# Altium integrated library Weidmueller_OMNIMATE_Signal.IntLib: 2550 symbols (part 7 of 45) (continued)
## 1146740000 (continued)
OMNIMATE Signal - series BL/SL 5.08; PartNumber: 1146740000; Manufacturer: Weidmueller; Short_text_for_material: SL 5.08HC/03/90 3.2SN OR BX; Side_termination_characteristic: open side; Mounting_onto_the_PCB: Solder connection; Pitch_mm: 5.08 mm; Pitch_inch: 0.2 inch; No_of_poles: 3; Outgoing_elbow: 90°; Solder_pin_length_mm: 3.2 mm; Contact_material: Cu-Leg; Contact_surface: tinned; Insulating_material: PA GF; UL_94_flammability_rating: V-0; Rated_voltage_for_surge_voltage_class_pollution_degree_II_2: 400 V; Rated_voltage_use_group_B_UL_1059: 300 V; Rated_current_use_group_B_UL_1059: 15 A; PackageReference: SL_5_08HC_90_03; Colour: Orange; Packaging: Box; Qty: 100 PCS; Revision: V1; ComponentLink1Description: Manufacturer URL; ComponentLink1URL: http://www.weidmueller.com/; ComponentLink2Description: URL Link1; ComponentLink2URL: http://catalog.weidmueller.com/catalog/Start.do?localeId=en&ObjectID=1146740000
footprint SL_5_08HC_90_03 (OMNIMATE Signal - Serie BL/SL 5.08  SL 5.08HC/03/90 3.2)
pins: A1, A2, A3

## 1146740000_Single
designator J?
OMNIMATE Signal - series BL/SL 5.08; PartNumber: 1146740000; Manufacturer: Weidmueller; Short_text_for_material: SL 5.08HC/03/90 3.2SN OR BX; Side_termination_characteristic: open side; Mounting_onto_the_PCB: Solder connection; Pitch_mm: 5.08 mm; Pitch_inch: 0.2 inch; No_of_poles: 3; Outgoing_elbow: 90°; Solder_pin_length_mm: 3.2 mm; Contact_material: Cu-Leg; Contact_surface: tinned; Insulating_material: PA GF; UL_94_flammability_rating: V-0; Rated_voltage_for_surge_voltage_class_pollution_degree_II_2: 400 V; Rated_voltage_use_group_B_UL_1059: 300 V; Rated_current_use_group_B_UL_1059: 15 A; PackageReference: SL_5_08HC_90_03; Colour: Orange; Packaging: Box; Qty: 100 PCS; Revision: V1; ComponentLink1Description: Manufacturer URL; ComponentLink1URL: http://www.weidmueller.com/; ComponentLink2Description: URL Link1; ComponentLink2URL: http://catalog.weidmueller.com/catalog/Start.do?localeId=en&ObjectID=1146740000
footprint SL_5_08HC_90_03 (OMNIMATE Signal - Serie BL/SL 5.08  SL 5.08HC/03/90 3.2)
part A pins: A1
part B pins: A2
part C pins: A3

## 1146770000
designator J?
OMNIMATE Signal - series BL/SL 5.08; PartNumber: 1146770000; Manufacturer: Weidmueller; Short_text_for_material: SL 5.08HC/04/90 3.2SN OR BX; Side_termination_characteristic: open side; Mounting_onto_the_PCB: Solder connection; Pitch_mm: 5.08 mm; Pitch_inch: 0.2 inch; No_of_poles: 4; Outgoing_elbow: 90°; Solder_pin_length_mm: 3.2 mm; Contact_material: Cu-Leg; Contact_surface: tinned; Insulating_material: PA GF; UL_94_flammability_rating: V-0; Rated_voltage_for_surge_voltage_class_pollution_degree_II_2: 400 V; Rated_voltage_use_group_B_UL_1059: 300 V; Rated_current_use_group_B_UL_1059: 15 A; PackageReference: SL_5_08HC_90_04; Colour: Orange; Packaging: Box; Qty: 100 PCS; Revision: V1; ComponentLink1Description: Manufacturer URL; ComponentLink1URL: http://www.weidmueller.com/; ComponentLink2Description: URL Link1; ComponentLink2URL: http://catalog.weidmueller.com/catalog/Start.do?localeId=en&ObjectID=1146770000
footprint SL_5_08HC_90_04 (OMNIMATE Signal - Serie BL/SL 5.08  SL 5.08HC/04/90 3.2)
pins: A1, A2, A3, A4

## 1146770000_Single
designator J?
OMNIMATE Signal - series BL/SL 5.08; PartNumber: 1146770000; Manufacturer: Weidmueller; Short_text_for_material: SL 5.08HC/04/90 3.2SN OR BX; Side_termination_characteristic: open side; Mounting_onto_the_PCB: Solder connection; Pitch_mm: 5.08 mm; Pitch_inch: 0.2 inch; No_of_poles: 4; Outgoing_elbow: 90°; Solder_pin_length_mm: 3.2 mm; Contact_material: Cu-Leg; Contact_surface: tinned; Insulating_material: PA GF; UL_94_flammability_rating: V-0; Rated_voltage_for_surge_voltage_class_pollution_degree_II_2: 400 V; Rated_voltage_use_group_B_UL_1059: 300 V; Rated_current_use_group_B_UL_1059: 15 A; PackageReference: SL_5_08HC_90_04; Colour: Orange; Packaging: Box; Qty: 100 PCS; Revision: V1; ComponentLink1Description: Manufacturer URL; ComponentLink1URL: http://www.weidmueller.com/; ComponentLink2Description: URL Link1; ComponentLink2URL: http://catalog.weidmueller.com/catalog/Start.do?localeId=en&ObjectID=1146770000
footprint SL_5_08HC_90_04 (OMNIMATE Signal - Serie BL/SL 5.08  SL 5.08HC/04/90 3.2)
part A pins: A1
part B pins: A2
part C pins: A3
part D pins: A4

## 1146850000
designator J?
OMNIMATE Signal - series BL/SL 5.08; PartNumber: 1146850000; Manufacturer: Weidmueller; Short_text_for_material: SL 5.08HC/08/90 3.2SN OR BX; Side_termination_characteristic: open side; Mounting_onto_the_PCB: Solder connection; Pitch_mm: 5.08 mm; Pitch_inch: 0.2 inch; No_of_poles: 8; Outgoing_elbow: 90°; Solder_pin_length_mm: 3.2 mm; Contact_material: Cu-Leg; Contact_surface: tinned; Insulating_material: PA GF; UL_94_flammability_rating: V-0; Rated_voltage_for_surge_voltage_class_pollution_degree_II_2: 400 V; Rated_voltage_use_group_B_UL_1059: 300 V; Rated_current_use_group_B_UL_1059: 15 A; PackageReference: SL_5_08HC_90_08; Colour: Orange; Packaging: Box; Qty: 50 PCS; Revision: V1; ComponentLink1Description: Manufacturer URL; ComponentLink1URL: http://www.weidmueller.com/; ComponentLink2Description: URL Link1; ComponentLink2URL: http://catalog.weidmueller.com/catalog/Start.do?localeId=en&ObjectID=1146850000
footprint SL_5_08HC_90_08 (OMNIMATE Signal - Serie BL/SL 5.08  SL 5.08HC/08/90 3.2)
pins: A1, A2, A3, A4, A5, A6, A7, A8

## 1146850000_Single
designator J?
OMNIMATE Signal - series BL/SL 5.08; PartNumber: 1146850000; Manufacturer: Weidmueller; Short_text_for_material: SL 5.08HC/08/90 3.2SN OR BX; Side_termination_characteristic: open side; Mounting_onto_the_PCB: Solder connection; Pitch_mm: 5.08 mm; Pitch_inch: 0.2 inch; No_of_poles: 8; Outgoing_elbow: 90°; Solder_pin_length_mm: 3.2 mm; Contact_material: Cu-Leg; Contact_surface: tinned; Insulating_material: PA GF; UL_94_flammability_rating: V-0; Rated_voltage_for_surge_voltage_class_pollution_degree_II_2: 400 V; Rated_voltage_use_group_B_UL_1059: 300 V; Rated_current_use_group_B_UL_1059: 15 A; PackageReference: SL_5_08HC_90_08; Colour: Orange; Packaging: Box; Qty: 50 PCS; Revision: V1; ComponentLink1Description: Manufacturer URL; ComponentLink1URL: http://www.weidmueller.com/; ComponentLink2Description: URL Link1; ComponentLink2URL: http://catalog.weidmueller.com/catalog/Start.do?localeId=en&ObjectID=1146850000
footprint SL_5_08HC_90_08 (OMNIMATE Signal - Serie BL/SL 5.08  SL 5.08HC/08/90 3.2)
part A pins: A1
part B pins: A2
part C pins: A3
part D pins: A4
part E pins: A5
part F pins: A6
part G pins: A7
part H pins: A8

## 1147130000
designator J?
OMNIMATE Signal - series BL/SL 5.08; PartNumber: 1147130000; Manufacturer: Weidmueller; Short_text_for_material: SL 5.08HC/02/180F 3.2SN OR BX; Side_termination_characteristic: Flange; Mounting_onto_the_PCB: Solder connection; Pitch_mm: 5.08 mm; Pitch_inch: 0.2 inch; No_of_poles: 2; Outgoing_elbow: 180°; Solder_pin_length_mm: 3.2 mm; Contact_material: Cu-Leg; Contact_surface: tinned; Insulating_material: PA GF; UL_94_flammability_rating: V-0; Rated_voltage_for_surge_voltage_class_pollution_degree_II_2: 400 V; Rated_voltage_use_group_B_UL_1059: 300 V; Rated_current_use_group_B_UL_1059: 16 A; PackageReference: SL_5_08HC_180F_02; Colour: Orange; Packaging: Box; Qty: 100 PCS; Revision: V1; ComponentLink1Description: Manufacturer URL; ComponentLink1URL: http://www.weidmueller.com/; ComponentLink2Description: URL Link1; ComponentLink2URL: http://catalog.weidmueller.com/catalog/Start.do?localeId=en&ObjectID=1147130000
footprint SL_5_08HC_180F_02 (OMNIMATE Signal - Serie BL/SL 5.08  SL 5.08HC/02/180F 3.2)
pins: A1, A2

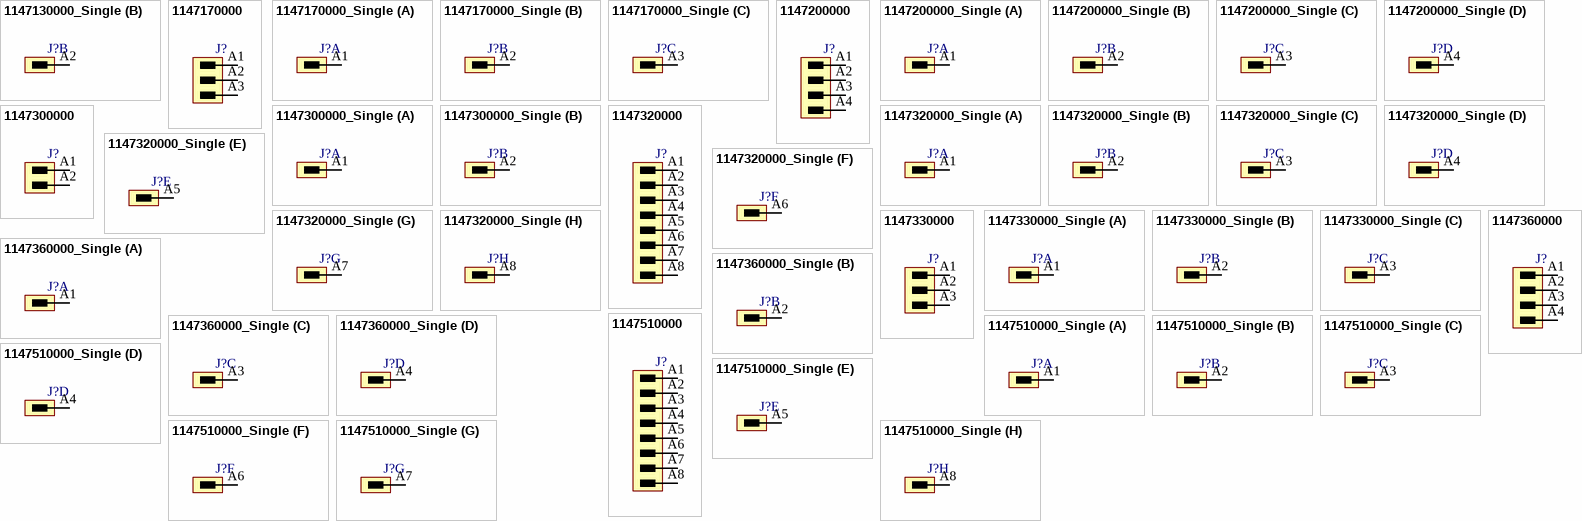
[diagram p42: symbols 1147130000_Single to 1147510000_Single]

## 1147130000_Single
designator J?
OMNIMATE Signal - series BL/SL 5.08; PartNumber: 1147130000; Manufacturer: Weidmueller; Short_text_for_material: SL 5.08HC/02/180F 3.2SN OR BX; Side_termination_characteristic: Flange; Mounting_onto_the_PCB: Solder connection; Pitch_mm: 5.08 mm; Pitch_inch: 0.2 inch; No_of_poles: 2; Outgoing_elbow: 180°; Solder_pin_length_mm: 3.2 mm; Contact_material: Cu-Leg; Contact_surface: tinned; Insulating_material: PA GF; UL_94_flammability_rating: V-0; Rated_voltage_for_surge_voltage_class_pollution_degree_II_2: 400 V; Rated_voltage_use_group_B_UL_1059: 300 V; Rated_current_use_group_B_UL_1059: 16 A; PackageReference: SL_5_08HC_180F_02; Colour: Orange; Packaging: Box; Qty: 100 PCS; Revision: V1; ComponentLink1Description: Manufacturer URL; ComponentLink1URL: http://www.weidmueller.com/; ComponentLink2Description: URL Link1; ComponentLink2URL: http://catalog.weidmueller.com/catalog/Start.do?localeId=en&ObjectID=1147130000
footprint SL_5_08HC_180F_02 (OMNIMATE Signal - Serie BL/SL 5.08  SL 5.08HC/02/180F 3.2)
part A pins: A1
part B pins: A2

## 1147170000
designator J?
OMNIMATE Signal - series BL/SL 5.08; PartNumber: 1147170000; Manufacturer: Weidmueller; Short_text_for_material: SL 5.08HC/03/180F 3.2SN OR BX; Side_termination_characteristic: Flange; Mounting_onto_the_PCB: Solder connection; Pitch_mm: 5.08 mm; Pitch_inch: 0.2 inch; No_of_poles: 3; Outgoing_elbow: 180°; Solder_pin_length_mm: 3.2 mm; Contact_material: Cu-Leg; Contact_surface: tinned; Insulating_material: PA GF; UL_94_flammability_rating: V-0; Rated_voltage_for_surge_voltage_class_pollution_degree_II_2: 400 V; Rated_voltage_use_group_B_UL_1059: 300 V; Rated_current_use_group_B_UL_1059: 16 A; PackageReference: SL_5_08HC_180F_03; Colour: Orange; Packaging: Box; Qty: 100 PCS; Revision: V1; ComponentLink1Description: Manufacturer URL; ComponentLink1URL: http://www.weidmueller.com/; ComponentLink2Description: URL Link1; ComponentLink2URL: http://catalog.weidmueller.com/catalog/Start.do?localeId=en&ObjectID=1147170000
footprint SL_5_08HC_180F_03 (OMNIMATE Signal - Serie BL/SL 5.08  SL 5.08HC/03/180F 3.2)
pins: A1, A2, A3

## 1147170000_Single
designator J?
OMNIMATE Signal - series BL/SL 5.08; PartNumber: 1147170000; Manufacturer: Weidmueller; Short_text_for_material: SL 5.08HC/03/180F 3.2SN OR BX; Side_termination_characteristic: Flange; Mounting_onto_the_PCB: Solder connection; Pitch_mm: 5.08 mm; Pitch_inch: 0.2 inch; No_of_poles: 3; Outgoing_elbow: 180°; Solder_pin_length_mm: 3.2 mm; Contact_material: Cu-Leg; Contact_surface: tinned; Insulating_material: PA GF; UL_94_flammability_rating: V-0; Rated_voltage_for_surge_voltage_class_pollution_degree_II_2: 400 V; Rated_voltage_use_group_B_UL_1059: 300 V; Rated_current_use_group_B_UL_1059: 16 A; PackageReference: SL_5_08HC_180F_03; Colour: Orange; Packaging: Box; Qty: 100 PCS; Revision: V1; ComponentLink1Description: Manufacturer URL; ComponentLink1URL: http://www.weidmueller.com/; ComponentLink2Description: URL Link1; ComponentLink2URL: http://catalog.weidmueller.com/catalog/Start.do?localeId=en&ObjectID=1147170000
footprint SL_5_08HC_180F_03 (OMNIMATE Signal - Serie BL/SL 5.08  SL 5.08HC/03/180F 3.2)
part A pins: A1
part B pins: A2
part C pins: A3

## 1147200000
designator J?
OMNIMATE Signal - series BL/SL 5.08; PartNumber: 1147200000; Manufacturer: Weidmueller; Short_text_for_material: SL 5.08HC/04/180F 3.2SN OR BX; Side_termination_characteristic: Flange; Mounting_onto_the_PCB: Solder connection; Pitch_mm: 5.08 mm; Pitch_inch: 0.2 inch; No_of_poles: 4; Outgoing_elbow: 180°; Solder_pin_length_mm: 3.2 mm; Contact_material: Cu-Leg; Contact_surface: tinned; Insulating_material: PA GF; UL_94_flammability_rating: V-0; Rated_voltage_for_surge_voltage_class_pollution_degree_II_2: 400 V; Rated_voltage_use_group_B_UL_1059: 300 V; Rated_current_use_group_B_UL_1059: 16 A; PackageReference: SL_5_08HC_180F_04; Colour: Orange; Packaging: Box; Qty: 100 PCS; Revision: V1; ComponentLink1Description: Manufacturer URL; ComponentLink1URL: http://www.weidmueller.com/; ComponentLink2Description: URL Link1; ComponentLink2URL: http://catalog.weidmueller.com/catalog/Start.do?localeId=en&ObjectID=1147200000
footprint SL_5_08HC_180F_04 (OMNIMATE Signal - Serie BL/SL 5.08  SL 5.08HC/04/180F 3.2)
pins: A1, A2, A3, A4

## 1147200000_Single
designator J?
OMNIMATE Signal - series BL/SL 5.08; PartNumber: 1147200000; Manufacturer: Weidmueller; Short_text_for_material: SL 5.08HC/04/180F 3.2SN OR BX; Side_termination_characteristic: Flange; Mounting_onto_the_PCB: Solder connection; Pitch_mm: 5.08 mm; Pitch_inch: 0.2 inch; No_of_poles: 4; Outgoing_elbow: 180°; Solder_pin_length_mm: 3.2 mm; Contact_material: Cu-Leg; Contact_surface: tinned; Insulating_material: PA GF; UL_94_flammability_rating: V-0; Rated_voltage_for_surge_voltage_class_pollution_degree_II_2: 400 V; Rated_voltage_use_group_B_UL_1059: 300 V; Rated_current_use_group_B_UL_1059: 16 A; PackageReference: SL_5_08HC_180F_04; Colour: Orange; Packaging: Box; Qty: 100 PCS; Revision: V1; ComponentLink1Description: Manufacturer URL; ComponentLink1URL: http://www.weidmueller.com/; ComponentLink2Description: URL Link1; ComponentLink2URL: http://catalog.weidmueller.com/catalog/Start.do?localeId=en&ObjectID=1147200000
footprint SL_5_08HC_180F_04 (OMNIMATE Signal - Serie BL/SL 5.08  SL 5.08HC/04/180F 3.2)
part A pins: A1
part B pins: A2
part C pins: A3
part D pins: A4

## 1147300000
designator J?
OMNIMATE Signal - series BL/SL 5.08; PartNumber: 1147300000; Manufacturer: Weidmueller; Short_text_for_material: SL 5.08HC/02/180B 3.2SN OR BX; Side_termination_characteristic: Dovetails for fixing blocks; Mounting_onto_the_PCB: Solder connection; Pitch_mm: 5.08 mm; Pitch_inch: 0.2 inch; No_of_poles: 2; Outgoing_elbow: 180°; Solder_pin_length_mm: 3.2 mm; Contact_material: Cu-Leg; Contact_surface: tinned; Insulating_material: PA GF; UL_94_flammability_rating: V-0; Rated_voltage_for_surge_voltage_class_pollution_degree_II_2: 400 V; Rated_voltage_use_group_B_UL_1059: 300 V; Rated_current_use_group_B_UL_1059: 16 A; PackageReference: SL_5_08HC_180B_02; Colour: Orange; Packaging: Box; Qty: 100 PCS; Revision: V1; ComponentLink1Description: Manufacturer URL; ComponentLink1URL: http://www.weidmueller.com/; ComponentLink2Description: URL Link1; ComponentLink2URL: http://catalog.weidmueller.com/catalog/Start.do?localeId=en&ObjectID=1147300000
footprint SL_5_08HC_180B_02 (OMNIMATE Signal - Serie BL/SL 5.08  SL 5.08HC/02/180B 3.2)
pins: A1, A2

## 1147300000_Single
designator J?
OMNIMATE Signal - series BL/SL 5.08; PartNumber: 1147300000; Manufacturer: Weidmueller; Short_text_for_material: SL 5.08HC/02/180B 3.2SN OR BX; Side_termination_characteristic: Dovetails for fixing blocks; Mounting_onto_the_PCB: Solder connection; Pitch_mm: 5.08 mm; Pitch_inch: 0.2 inch; No_of_poles: 2; Outgoing_elbow: 180°; Solder_pin_length_mm: 3.2 mm; Contact_material: Cu-Leg; Contact_surface: tinned; Insulating_material: PA GF; UL_94_flammability_rating: V-0; Rated_voltage_for_surge_voltage_class_pollution_degree_II_2: 400 V; Rated_voltage_use_group_B_UL_1059: 300 V; Rated_current_use_group_B_UL_1059: 16 A; PackageReference: SL_5_08HC_180B_02; Colour: Orange; Packaging: Box; Qty: 100 PCS; Revision: V1; ComponentLink1Description: Manufacturer URL; ComponentLink1URL: http://www.weidmueller.com/; ComponentLink2Description: URL Link1; ComponentLink2URL: http://catalog.weidmueller.com/catalog/Start.do?localeId=en&ObjectID=1147300000
footprint SL_5_08HC_180B_02 (OMNIMATE Signal - Serie BL/SL 5.08  SL 5.08HC/02/180B 3.2)
part A pins: A1
part B pins: A2

## 1147320000
designator J?
OMNIMATE Signal - series BL/SL 5.08; PartNumber: 1147320000; Manufacturer: Weidmueller; Short_text_for_material: SL 5.08HC/08/180F 3.2SN OR BX; Side_termination_characteristic: Flange; Mounting_onto_the_PCB: Solder connection; Pitch_mm: 5.08 mm; Pitch_inch: 0.2 inch; No_of_poles: 8; Outgoing_elbow: 180°; Solder_pin_length_mm: 3.2 mm; Contact_material: Cu-Leg; Contact_surface: tinned; Insulating_material: PA GF; UL_94_flammability_rating: V-0; Rated_voltage_for_surge_voltage_class_pollution_degree_II_2: 400 V; Rated_voltage_use_group_B_UL_1059: 300 V; Rated_current_use_group_B_UL_1059: 16 A; PackageReference: SL_5_08HC_180F_08; Colour: Orange; Packaging: Box; Qty: 50 PCS; Revision: V1; ComponentLink1Description: Manufacturer URL; ComponentLink1URL: http://www.weidmueller.com/; ComponentLink2Description: URL Link1; ComponentLink2URL: http://catalog.weidmueller.com/catalog/Start.do?localeId=en&ObjectID=1147320000
footprint SL_5_08HC_180F_08 (OMNIMATE Signal - Serie BL/SL 5.08  SL 5.08HC/08/180F 3.2)
pins: A1, A2, A3, A4, A5, A6, A7, A8

## 1147320000_Single
designator J?
OMNIMATE Signal - series BL/SL 5.08; PartNumber: 1147320000; Manufacturer: Weidmueller; Short_text_for_material: SL 5.08HC/08/180F 3.2SN OR BX; Side_termination_characteristic: Flange; Mounting_onto_the_PCB: Solder connection; Pitch_mm: 5.08 mm; Pitch_inch: 0.2 inch; No_of_poles: 8; Outgoing_elbow: 180°; Solder_pin_length_mm: 3.2 mm; Contact_material: Cu-Leg; Contact_surface: tinned; Insulating_material: PA GF; UL_94_flammability_rating: V-0; Rated_voltage_for_surge_voltage_class_pollution_degree_II_2: 400 V; Rated_voltage_use_group_B_UL_1059: 300 V; Rated_current_use_group_B_UL_1059: 16 A; PackageReference: SL_5_08HC_180F_08; Colour: Orange; Packaging: Box; Qty: 50 PCS; Revision: V1; ComponentLink1Description: Manufacturer URL; ComponentLink1URL: http://www.weidmueller.com/; ComponentLink2Description: URL Link1; ComponentLink2URL: http://catalog.weidmueller.com/catalog/Start.do?localeId=en&ObjectID=1147320000
footprint SL_5_08HC_180F_08 (OMNIMATE Signal - Serie BL/SL 5.08  SL 5.08HC/08/180F 3.2)
part A pins: A1
part B pins: A2
part C pins: A3
part D pins: A4
part E pins: A5
part F pins: A6
part G pins: A7
part H pins: A8

## 1147330000
designator J?
OMNIMATE Signal - series BL/SL 5.08; PartNumber: 1147330000; Manufacturer: Weidmueller; Short_text_for_material: SL 5.08HC/03/180B 3.2SN OR BX; Side_termination_characteristic: Dovetails for fixing blocks; Mounting_onto_the_PCB: Solder connection; Pitch_mm: 5.08 mm; Pitch_inch: 0.2 inch; No_of_poles: 3; Outgoing_elbow: 180°; Solder_pin_length_mm: 3.2 mm; Contact_material: Cu-Leg; Contact_surface: tinned; Insulating_material: PA GF; UL_94_flammability_rating: V-0; Rated_voltage_for_surge_voltage_class_pollution_degree_II_2: 400 V; Rated_voltage_use_group_B_UL_1059: 300 V; Rated_current_use_group_B_UL_1059: 16 A; PackageReference: SL_5_08HC_180B_03; Colour: Orange; Packaging: Box; Qty: 100 PCS; Revision: V1; ComponentLink1Description: Manufacturer URL; ComponentLink1URL: http://www.weidmueller.com/; ComponentLink2Description: URL Link1; ComponentLink2URL: http://catalog.weidmueller.com/catalog/Start.do?localeId=en&ObjectID=1147330000
footprint SL_5_08HC_180B_03 (OMNIMATE Signal - Serie BL/SL 5.08  SL 5.08HC/03/180B 3.2)
pins: A1, A2, A3

## 1147330000_Single
designator J?
OMNIMATE Signal - series BL/SL 5.08; PartNumber: 1147330000; Manufacturer: Weidmueller; Short_text_for_material: SL 5.08HC/03/180B 3.2SN OR BX; Side_termination_characteristic: Dovetails for fixing blocks; Mounting_onto_the_PCB: Solder connection; Pitch_mm: 5.08 mm; Pitch_inch: 0.2 inch; No_of_poles: 3; Outgoing_elbow: 180°; Solder_pin_length_mm: 3.2 mm; Contact_material: Cu-Leg; Contact_surface: tinned; Insulating_material: PA GF; UL_94_flammability_rating: V-0; Rated_voltage_for_surge_voltage_class_pollution_degree_II_2: 400 V; Rated_voltage_use_group_B_UL_1059: 300 V; Rated_current_use_group_B_UL_1059: 16 A; PackageReference: SL_5_08HC_180B_03; Colour: Orange; Packaging: Box; Qty: 100 PCS; Revision: V1; ComponentLink1Description: Manufacturer URL; ComponentLink1URL: http://www.weidmueller.com/; ComponentLink2Description: URL Link1; ComponentLink2URL: http://catalog.weidmueller.com/catalog/Start.do?localeId=en&ObjectID=1147330000
footprint SL_5_08HC_180B_03 (OMNIMATE Signal - Serie BL/SL 5.08  SL 5.08HC/03/180B 3.2)
part A pins: A1
part B pins: A2
part C pins: A3

## 1147360000
designator J?
OMNIMATE Signal - series BL/SL 5.08; PartNumber: 1147360000; Manufacturer: Weidmueller; Short_text_for_material: SL 5.08HC/04/180B 3.2SN OR BX; Side_termination_characteristic: Dovetails for fixing blocks; Mounting_onto_the_PCB: Solder connection; Pitch_mm: 5.08 mm; Pitch_inch: 0.2 inch; No_of_poles: 4; Outgoing_elbow: 180°; Solder_pin_length_mm: 3.2 mm; Contact_material: Cu-Leg; Contact_surface: tinned; Insulating_material: PA GF; UL_94_flammability_rating: V-0; Rated_voltage_for_surge_voltage_class_pollution_degree_II_2: 400 V; Rated_voltage_use_group_B_UL_1059: 300 V; Rated_current_use_group_B_UL_1059: 16 A; PackageReference: SL_5_08HC_180B_04; Colour: Orange; Packaging: Box; Qty: 100 PCS; Revision: V1; ComponentLink1Description: Manufacturer URL; ComponentLink1URL: http://www.weidmueller.com/; ComponentLink2Description: URL Link1; ComponentLink2URL: http://catalog.weidmueller.com/catalog/Start.do?localeId=en&ObjectID=1147360000
footprint SL_5_08HC_180B_04 (OMNIMATE Signal - Serie BL/SL 5.08  SL 5.08HC/04/180B 3.2)
pins: A1, A2, A3, A4

## 1147360000_Single
designator J?
OMNIMATE Signal - series BL/SL 5.08; PartNumber: 1147360000; Manufacturer: Weidmueller; Short_text_for_material: SL 5.08HC/04/180B 3.2SN OR BX; Side_termination_characteristic: Dovetails for fixing blocks; Mounting_onto_the_PCB: Solder connection; Pitch_mm: 5.08 mm; Pitch_inch: 0.2 inch; No_of_poles: 4; Outgoing_elbow: 180°; Solder_pin_length_mm: 3.2 mm; Contact_material: Cu-Leg; Contact_surface: tinned; Insulating_material: PA GF; UL_94_flammability_rating: V-0; Rated_voltage_for_surge_voltage_class_pollution_degree_II_2: 400 V; Rated_voltage_use_group_B_UL_1059: 300 V; Rated_current_use_group_B_UL_1059: 16 A; PackageReference: SL_5_08HC_180B_04; Colour: Orange; Packaging: Box; Qty: 100 PCS; Revision: V1; ComponentLink1Description: Manufacturer URL; ComponentLink1URL: http://www.weidmueller.com/; ComponentLink2Description: URL Link1; ComponentLink2URL: http://catalog.weidmueller.com/catalog/Start.do?localeId=en&ObjectID=1147360000
footprint SL_5_08HC_180B_04 (OMNIMATE Signal - Serie BL/SL 5.08  SL 5.08HC/04/180B 3.2)
part A pins: A1
part B pins: A2
part C pins: A3
part D pins: A4

## 1147510000
designator J?
OMNIMATE Signal - series BL/SL 5.08; PartNumber: 1147510000; Manufacturer: Weidmueller; Short_text_for_material: SL 5.08HC/08/180B 3.2SN OR BX; Side_termination_characteristic: Dovetails for fixing blocks; Mounting_onto_the_PCB: Solder connection; Pitch_mm: 5.08 mm; Pitch_inch: 0.2 inch; No_of_poles: 8; Outgoing_elbow: 180°; Solder_pin_length_mm: 3.2 mm; Contact_material: Cu-Leg; Contact_surface: tinned; Insulating_material: PA GF; UL_94_flammability_rating: V-0; Rated_voltage_for_surge_voltage_class_pollution_degree_II_2: 400 V; Rated_voltage_use_group_B_UL_1059: 300 V; Rated_current_use_group_B_UL_1059: 16 A; PackageReference: SL_5_08HC_180B_08; Colour: Orange; Packaging: Box; Qty: 50 PCS; Revision: V1; ComponentLink1Description: Manufacturer URL; ComponentLink1URL: http://www.weidmueller.com/; ComponentLink2Description: URL Link1; ComponentLink2URL: http://catalog.weidmueller.com/catalog/Start.do?localeId=en&ObjectID=1147510000
footprint SL_5_08HC_180B_08 (OMNIMATE Signal - Serie BL/SL 5.08  SL 5.08HC/08/180B 3.2)
pins: A1, A2, A3, A4, A5, A6, A7, A8

## 1147510000_Single
designator J?
OMNIMATE Signal - series BL/SL 5.08; PartNumber: 1147510000; Manufacturer: Weidmueller; Short_text_for_material: SL 5.08HC/08/180B 3.2SN OR BX; Side_termination_characteristic: Dovetails for fixing blocks; Mounting_onto_the_PCB: Solder connection; Pitch_mm: 5.08 mm; Pitch_inch: 0.2 inch; No_of_poles: 8; Outgoing_elbow: 180°; Solder_pin_length_mm: 3.2 mm; Contact_material: Cu-Leg; Contact_surface: tinned; Insulating_material: PA GF; UL_94_flammability_rating: V-0; Rated_voltage_for_surge_voltage_class_pollution_degree_II_2: 400 V; Rated_voltage_use_group_B_UL_1059: 300 V; Rated_current_use_group_B_UL_1059: 16 A; PackageReference: SL_5_08HC_180B_08; Colour: Orange; Packaging: Box; Qty: 50 PCS; Revision: V1; ComponentLink1Description: Manufacturer URL; ComponentLink1URL: http://www.weidmueller.com/; ComponentLink2Description: URL Link1; ComponentLink2URL: http://catalog.weidmueller.com/catalog/Start.do?localeId=en&ObjectID=1147510000
footprint SL_5_08HC_180B_08 (OMNIMATE Signal - Serie BL/SL 5.08  SL 5.08HC/08/180B 3.2)
part A pins: A1
part B pins: A2
part C pins: A3
part D pins: A4
part E pins: A5
part F pins: A6
part G pins: A7
part H pins: A8

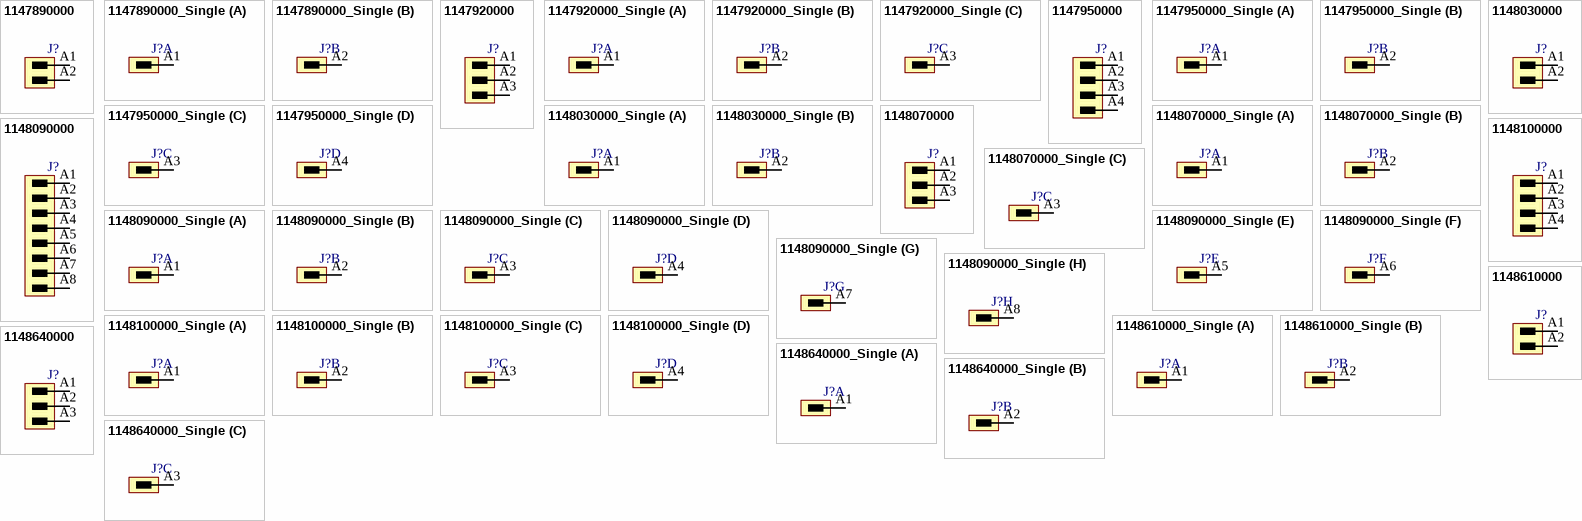
[diagram p43: symbols 1147890000 to 1148640000_Single]

## 1147890000
designator J?
OMNIMATE Signal - series BL/SL 5.08; PartNumber: 1147890000; Manufacturer: Weidmueller; Short_text_for_material: SL 5.08HC/02/180LF 3.2SN OR BX; Side_termination_characteristic: Solder flange; Mounting_onto_the_PCB: Solder connection; Pitch_mm: 5.08 mm; Pitch_inch: 0.2 inch; No_of_poles: 2; Outgoing_elbow: 180°; Solder_pin_length_mm: 3.2 mm; Contact_material: Cu-Leg; Contact_surface: tinned; Insulating_material: PA GF; UL_94_flammability_rating: V-0; Rated_voltage_for_surge_voltage_class_pollution_degree_II_2: 400 V; Rated_voltage_use_group_B_UL_1059: 300 V; Rated_current_use_group_B_UL_1059: 16 A; PackageReference: SL_5_08HC_180LF_02; Colour: Orange; Packaging: Box; Qty: 100 PCS; Revision: V1; ComponentLink1Description: Manufacturer URL; ComponentLink1URL: http://www.weidmueller.com/; ComponentLink2Description: URL Link1; ComponentLink2URL: http://catalog.weidmueller.com/catalog/Start.do?localeId=en&ObjectID=1147890000
footprint SL_5_08HC_180LF_02 (OMNIMATE Signal - Serie BL/SL 5.08  SL 5.08HC/02/180LF 3.2)
pins: A1, A2

## 1147890000_Single
designator J?
OMNIMATE Signal - series BL/SL 5.08; PartNumber: 1147890000; Manufacturer: Weidmueller; Short_text_for_material: SL 5.08HC/02/180LF 3.2SN OR BX; Side_termination_characteristic: Solder flange; Mounting_onto_the_PCB: Solder connection; Pitch_mm: 5.08 mm; Pitch_inch: 0.2 inch; No_of_poles: 2; Outgoing_elbow: 180°; Solder_pin_length_mm: 3.2 mm; Contact_material: Cu-Leg; Contact_surface: tinned; Insulating_material: PA GF; UL_94_flammability_rating: V-0; Rated_voltage_for_surge_voltage_class_pollution_degree_II_2: 400 V; Rated_voltage_use_group_B_UL_1059: 300 V; Rated_current_use_group_B_UL_1059: 16 A; PackageReference: SL_5_08HC_180LF_02; Colour: Orange; Packaging: Box; Qty: 100 PCS; Revision: V1; ComponentLink1Description: Manufacturer URL; ComponentLink1URL: http://www.weidmueller.com/; ComponentLink2Description: URL Link1; ComponentLink2URL: http://catalog.weidmueller.com/catalog/Start.do?localeId=en&ObjectID=1147890000
footprint SL_5_08HC_180LF_02 (OMNIMATE Signal - Serie BL/SL 5.08  SL 5.08HC/02/180LF 3.2)
part A pins: A1
part B pins: A2

## 1147920000
designator J?
OMNIMATE Signal - series BL/SL 5.08; PartNumber: 1147920000; Manufacturer: Weidmueller; Short_text_for_material: SL 5.08HC/03/180LF 3.2SN OR BX; Side_termination_characteristic: Solder flange; Mounting_onto_the_PCB: Solder connection; Pitch_mm: 5.08 mm; Pitch_inch: 0.2 inch; No_of_poles: 3; Outgoing_elbow: 180°; Solder_pin_length_mm: 3.2 mm; Contact_material: Cu-Leg; Contact_surface: tinned; Insulating_material: PA GF; UL_94_flammability_rating: V-0; Rated_voltage_for_surge_voltage_class_pollution_degree_II_2: 400 V; Rated_voltage_use_group_B_UL_1059: 300 V; Rated_current_use_group_B_UL_1059: 16 A; PackageReference: SL_5_08HC_180LF_03; Colour: Orange; Packaging: Box; Qty: 100 PCS; Revision: V1; ComponentLink1Description: Manufacturer URL; ComponentLink1URL: http://www.weidmueller.com/; ComponentLink2Description: URL Link1; ComponentLink2URL: http://catalog.weidmueller.com/catalog/Start.do?localeId=en&ObjectID=1147920000
footprint SL_5_08HC_180LF_03 (OMNIMATE Signal - Serie BL/SL 5.08  SL 5.08HC/03/180LF 3.2)
pins: A1, A2, A3

## 1147920000_Single
designator J?
OMNIMATE Signal - series BL/SL 5.08; PartNumber: 1147920000; Manufacturer: Weidmueller; Short_text_for_material: SL 5.08HC/03/180LF 3.2SN OR BX; Side_termination_characteristic: Solder flange; Mounting_onto_the_PCB: Solder connection; Pitch_mm: 5.08 mm; Pitch_inch: 0.2 inch; No_of_poles: 3; Outgoing_elbow: 180°; Solder_pin_length_mm: 3.2 mm; Contact_material: Cu-Leg; Contact_surface: tinned; Insulating_material: PA GF; UL_94_flammability_rating: V-0; Rated_voltage_for_surge_voltage_class_pollution_degree_II_2: 400 V; Rated_voltage_use_group_B_UL_1059: 300 V; Rated_current_use_group_B_UL_1059: 16 A; PackageReference: SL_5_08HC_180LF_03; Colour: Orange; Packaging: Box; Qty: 100 PCS; Revision: V1; ComponentLink1Description: Manufacturer URL; ComponentLink1URL: http://www.weidmueller.com/; ComponentLink2Description: URL Link1; ComponentLink2URL: http://catalog.weidmueller.com/catalog/Start.do?localeId=en&ObjectID=1147920000
footprint SL_5_08HC_180LF_03 (OMNIMATE Signal - Serie BL/SL 5.08  SL 5.08HC/03/180LF 3.2)
part A pins: A1
part B pins: A2
part C pins: A3

## 1147950000
designator J?
OMNIMATE Signal - series BL/SL 5.08; PartNumber: 1147950000; Manufacturer: Weidmueller; Short_text_for_material: SL 5.08HC/04/180LF 3.2SN OR BX; Side_termination_characteristic: Solder flange; Mounting_onto_the_PCB: Solder connection; Pitch_mm: 5.08 mm; Pitch_inch: 0.2 inch; No_of_poles: 4; Outgoing_elbow: 180°; Solder_pin_length_mm: 3.2 mm; Contact_material: Cu-Leg; Contact_surface: tinned; Insulating_material: PA GF; UL_94_flammability_rating: V-0; Rated_voltage_for_surge_voltage_class_pollution_degree_II_2: 400 V; Rated_voltage_use_group_B_UL_1059: 300 V; Rated_current_use_group_B_UL_1059: 16 A; PackageReference: SL_5_08HC_180LF_04; Colour: Orange; Packaging: Box; Qty: 100 PCS; Revision: V1; ComponentLink1Description: Manufacturer URL; ComponentLink1URL: http://www.weidmueller.com/; ComponentLink2Description: URL Link1; ComponentLink2URL: http://catalog.weidmueller.com/catalog/Start.do?localeId=en&ObjectID=1147950000
footprint SL_5_08HC_180LF_04 (OMNIMATE Signal - Serie BL/SL 5.08  SL 5.08HC/04/180LF 3.2)
pins: A1, A2, A3, A4

## 1147950000_Single
designator J?
OMNIMATE Signal - series BL/SL 5.08; PartNumber: 1147950000; Manufacturer: Weidmueller; Short_text_for_material: SL 5.08HC/04/180LF 3.2SN OR BX; Side_termination_characteristic: Solder flange; Mounting_onto_the_PCB: Solder connection; Pitch_mm: 5.08 mm; Pitch_inch: 0.2 inch; No_of_poles: 4; Outgoing_elbow: 180°; Solder_pin_length_mm: 3.2 mm; Contact_material: Cu-Leg; Contact_surface: tinned; Insulating_material: PA GF; UL_94_flammability_rating: V-0; Rated_voltage_for_surge_voltage_class_pollution_degree_II_2: 400 V; Rated_voltage_use_group_B_UL_1059: 300 V; Rated_current_use_group_B_UL_1059: 16 A; PackageReference: SL_5_08HC_180LF_04; Colour: Orange; Packaging: Box; Qty: 100 PCS; Revision: V1; ComponentLink1Description: Manufacturer URL; ComponentLink1URL: http://www.weidmueller.com/; ComponentLink2Description: URL Link1; ComponentLink2URL: http://catalog.weidmueller.com/catalog/Start.do?localeId=en&ObjectID=1147950000
footprint SL_5_08HC_180LF_04 (OMNIMATE Signal - Serie BL/SL 5.08  SL 5.08HC/04/180LF 3.2)
part A pins: A1
part B pins: A2
part C pins: A3
part D pins: A4

## 1148030000
designator J?
OMNIMATE Signal - series BL/SL 5.08; PartNumber: 1148030000; Manufacturer: Weidmueller; Short_text_for_material: SL 5.08HC/02/90B 3.2SN OR BX; Side_termination_characteristic: Dovetails for fixing blocks; Mounting_onto_the_PCB: Solder connection; Pitch_mm: 5.08 mm; Pitch_inch: 0.2 inch; No_of_poles: 2; Outgoing_elbow: 90°; Solder_pin_length_mm: 3.2 mm; Contact_material: Cu-Leg; Contact_surface: tinned; Insulating_material: PA GF; UL_94_flammability_rating: V-0; Rated_voltage_for_surge_voltage_class_pollution_degree_II_2: 400 V; Rated_voltage_use_group_B_UL_1059: 300 V; Rated_current_use_group_B_UL_1059: 15 A; PackageReference: SL_5_08HC_90B_02; Colour: Orange; Packaging: Box; Qty: 100 PCS; Revision: V1; ComponentLink1Description: Manufacturer URL; ComponentLink1URL: http://www.weidmueller.com/; ComponentLink2Description: URL Link1; ComponentLink2URL: http://catalog.weidmueller.com/catalog/Start.do?localeId=en&ObjectID=1148030000
footprint SL_5_08HC_90B_02 (OMNIMATE Signal - Serie BL/SL 5.08  SL 5.08HC/02/90B 3.2)
pins: A1, A2

## 1148030000_Single
designator J?
OMNIMATE Signal - series BL/SL 5.08; PartNumber: 1148030000; Manufacturer: Weidmueller; Short_text_for_material: SL 5.08HC/02/90B 3.2SN OR BX; Side_termination_characteristic: Dovetails for fixing blocks; Mounting_onto_the_PCB: Solder connection; Pitch_mm: 5.08 mm; Pitch_inch: 0.2 inch; No_of_poles: 2; Outgoing_elbow: 90°; Solder_pin_length_mm: 3.2 mm; Contact_material: Cu-Leg; Contact_surface: tinned; Insulating_material: PA GF; UL_94_flammability_rating: V-0; Rated_voltage_for_surge_voltage_class_pollution_degree_II_2: 400 V; Rated_voltage_use_group_B_UL_1059: 300 V; Rated_current_use_group_B_UL_1059: 15 A; PackageReference: SL_5_08HC_90B_02; Colour: Orange; Packaging: Box; Qty: 100 PCS; Revision: V1; ComponentLink1Description: Manufacturer URL; ComponentLink1URL: http://www.weidmueller.com/; ComponentLink2Description: URL Link1; ComponentLink2URL: http://catalog.weidmueller.com/catalog/Start.do?localeId=en&ObjectID=1148030000
footprint SL_5_08HC_90B_02 (OMNIMATE Signal - Serie BL/SL 5.08  SL 5.08HC/02/90B 3.2)
part A pins: A1
part B pins: A2

## 1148070000
designator J?
OMNIMATE Signal - series BL/SL 5.08; PartNumber: 1148070000; Manufacturer: Weidmueller; Short_text_for_material: SL 5.08HC/03/90B 3.2SN OR BX; Side_termination_characteristic: Dovetails for fixing blocks; Mounting_onto_the_PCB: Solder connection; Pitch_mm: 5.08 mm; Pitch_inch: 0.2 inch; No_of_poles: 3; Outgoing_elbow: 90°; Solder_pin_length_mm: 3.2 mm; Contact_material: Cu-Leg; Contact_surface: tinned; Insulating_material: PA GF; UL_94_flammability_rating: V-0; Rated_voltage_for_surge_voltage_class_pollution_degree_II_2: 400 V; Rated_voltage_use_group_B_UL_1059: 300 V; Rated_current_use_group_B_UL_1059: 15 A; PackageReference: SL_5_08HC_90B_03; Colour: Orange; Packaging: Box; Qty: 100 PCS; Revision: V1; ComponentLink1Description: Manufacturer URL; ComponentLink1URL: http://www.weidmueller.com/; ComponentLink2Description: URL Link1; ComponentLink2URL: http://catalog.weidmueller.com/catalog/Start.do?localeId=en&ObjectID=1148070000
footprint SL_5_08HC_90B_03 (OMNIMATE Signal - Serie BL/SL 5.08  SL 5.08HC/03/90B 3.2)
pins: A1, A2, A3

## 1148070000_Single
designator J?
OMNIMATE Signal - series BL/SL 5.08; PartNumber: 1148070000; Manufacturer: Weidmueller; Short_text_for_material: SL 5.08HC/03/90B 3.2SN OR BX; Side_termination_characteristic: Dovetails for fixing blocks; Mounting_onto_the_PCB: Solder connection; Pitch_mm: 5.08 mm; Pitch_inch: 0.2 inch; No_of_poles: 3; Outgoing_elbow: 90°; Solder_pin_length_mm: 3.2 mm; Contact_material: Cu-Leg; Contact_surface: tinned; Insulating_material: PA GF; UL_94_flammability_rating: V-0; Rated_voltage_for_surge_voltage_class_pollution_degree_II_2: 400 V; Rated_voltage_use_group_B_UL_1059: 300 V; Rated_current_use_group_B_UL_1059: 15 A; PackageReference: SL_5_08HC_90B_03; Colour: Orange; Packaging: Box; Qty: 100 PCS; Revision: V1; ComponentLink1Description: Manufacturer URL; ComponentLink1URL: http://www.weidmueller.com/; ComponentLink2Description: URL Link1; ComponentLink2URL: http://catalog.weidmueller.com/catalog/Start.do?localeId=en&ObjectID=1148070000
footprint SL_5_08HC_90B_03 (OMNIMATE Signal - Serie BL/SL 5.08  SL 5.08HC/03/90B 3.2)
part A pins: A1
part B pins: A2
part C pins: A3

## 1148090000
designator J?
OMNIMATE Signal - series BL/SL 5.08; PartNumber: 1148090000; Manufacturer: Weidmueller; Short_text_for_material: SL 5.08HC/08/180LF 3.2SN OR BX; Side_termination_characteristic: Solder flange; Mounting_onto_the_PCB: Solder connection; Pitch_mm: 5.08 mm; Pitch_inch: 0.2 inch; No_of_poles: 8; Outgoing_elbow: 180°; Solder_pin_length_mm: 3.2 mm; Contact_material: Cu-Leg; Contact_surface: tinned; Insulating_material: PA GF; UL_94_flammability_rating: V-0; Rated_voltage_for_surge_voltage_class_pollution_degree_II_2: 400 V; Rated_voltage_use_group_B_UL_1059: 300 V; Rated_current_use_group_B_UL_1059: 16 A; PackageReference: SL_5_08HC_180LF_08; Colour: Orange; Packaging: Box; Qty: 50 PCS; Revision: V1; ComponentLink1Description: Manufacturer URL; ComponentLink1URL: http://www.weidmueller.com/; ComponentLink2Description: URL Link1; ComponentLink2URL: http://catalog.weidmueller.com/catalog/Start.do?localeId=en&ObjectID=1148090000
footprint SL_5_08HC_180LF_08 (OMNIMATE Signal - Serie BL/SL 5.08  SL 5.08HC/08/180LF 3.2)
pins: A1, A2, A3, A4, A5, A6, A7, A8

## 1148090000_Single
designator J?
OMNIMATE Signal - series BL/SL 5.08; PartNumber: 1148090000; Manufacturer: Weidmueller; Short_text_for_material: SL 5.08HC/08/180LF 3.2SN OR BX; Side_termination_characteristic: Solder flange; Mounting_onto_the_PCB: Solder connection; Pitch_mm: 5.08 mm; Pitch_inch: 0.2 inch; No_of_poles: 8; Outgoing_elbow: 180°; Solder_pin_length_mm: 3.2 mm; Contact_material: Cu-Leg; Contact_surface: tinned; Insulating_material: PA GF; UL_94_flammability_rating: V-0; Rated_voltage_for_surge_voltage_class_pollution_degree_II_2: 400 V; Rated_voltage_use_group_B_UL_1059: 300 V; Rated_current_use_group_B_UL_1059: 16 A; PackageReference: SL_5_08HC_180LF_08; Colour: Orange; Packaging: Box; Qty: 50 PCS; Revision: V1; ComponentLink1Description: Manufacturer URL; ComponentLink1URL: http://www.weidmueller.com/; ComponentLink2Description: URL Link1; ComponentLink2URL: http://catalog.weidmueller.com/catalog/Start.do?localeId=en&ObjectID=1148090000
footprint SL_5_08HC_180LF_08 (OMNIMATE Signal - Serie BL/SL 5.08  SL 5.08HC/08/180LF 3.2)
part A pins: A1
part B pins: A2
part C pins: A3
part D pins: A4
part E pins: A5
part F pins: A6
part G pins: A7
part H pins: A8

## 1148100000
designator J?
OMNIMATE Signal - series BL/SL 5.08; PartNumber: 1148100000; Manufacturer: Weidmueller; Short_text_for_material: SL 5.08HC/04/90B 3.2SN OR BX; Side_termination_characteristic: Dovetails for fixing blocks; Mounting_onto_the_PCB: Solder connection; Pitch_mm: 5.08 mm; Pitch_inch: 0.2 inch; No_of_poles: 4; Outgoing_elbow: 90°; Solder_pin_length_mm: 3.2 mm; Contact_material: Cu-Leg; Contact_surface: tinned; Insulating_material: PA GF; UL_94_flammability_rating: V-0; Rated_voltage_for_surge_voltage_class_pollution_degree_II_2: 400 V; Rated_voltage_use_group_B_UL_1059: 300 V; Rated_current_use_group_B_UL_1059: 15 A; PackageReference: SL_5_08HC_90B_04; Colour: Orange; Packaging: Box; Qty: 100 PCS; Revision: V1; ComponentLink1Description: Manufacturer URL; ComponentLink1URL: http://www.weidmueller.com/; ComponentLink2Description: URL Link1; ComponentLink2URL: http://catalog.weidmueller.com/catalog/Start.do?localeId=en&ObjectID=1148100000
footprint SL_5_08HC_90B_04 (OMNIMATE Signal - Serie BL/SL 5.08  SL 5.08HC/04/90B 3.2)
pins: A1, A2, A3, A4